# Altium footprint library Airscout_PCB_Lib.PcbLib: 44 footprints (part 2 of 3)
Each footprint in its own frame and in the unit in brackets; x right, y up, seen from the top. Pads: shape width x height; smd on the part's side, far side on the other; paste and mask are expansions set on the pad; w line width, h text height; cw(c..) or ccw(c..) is an arc to the next point about the centre after c.
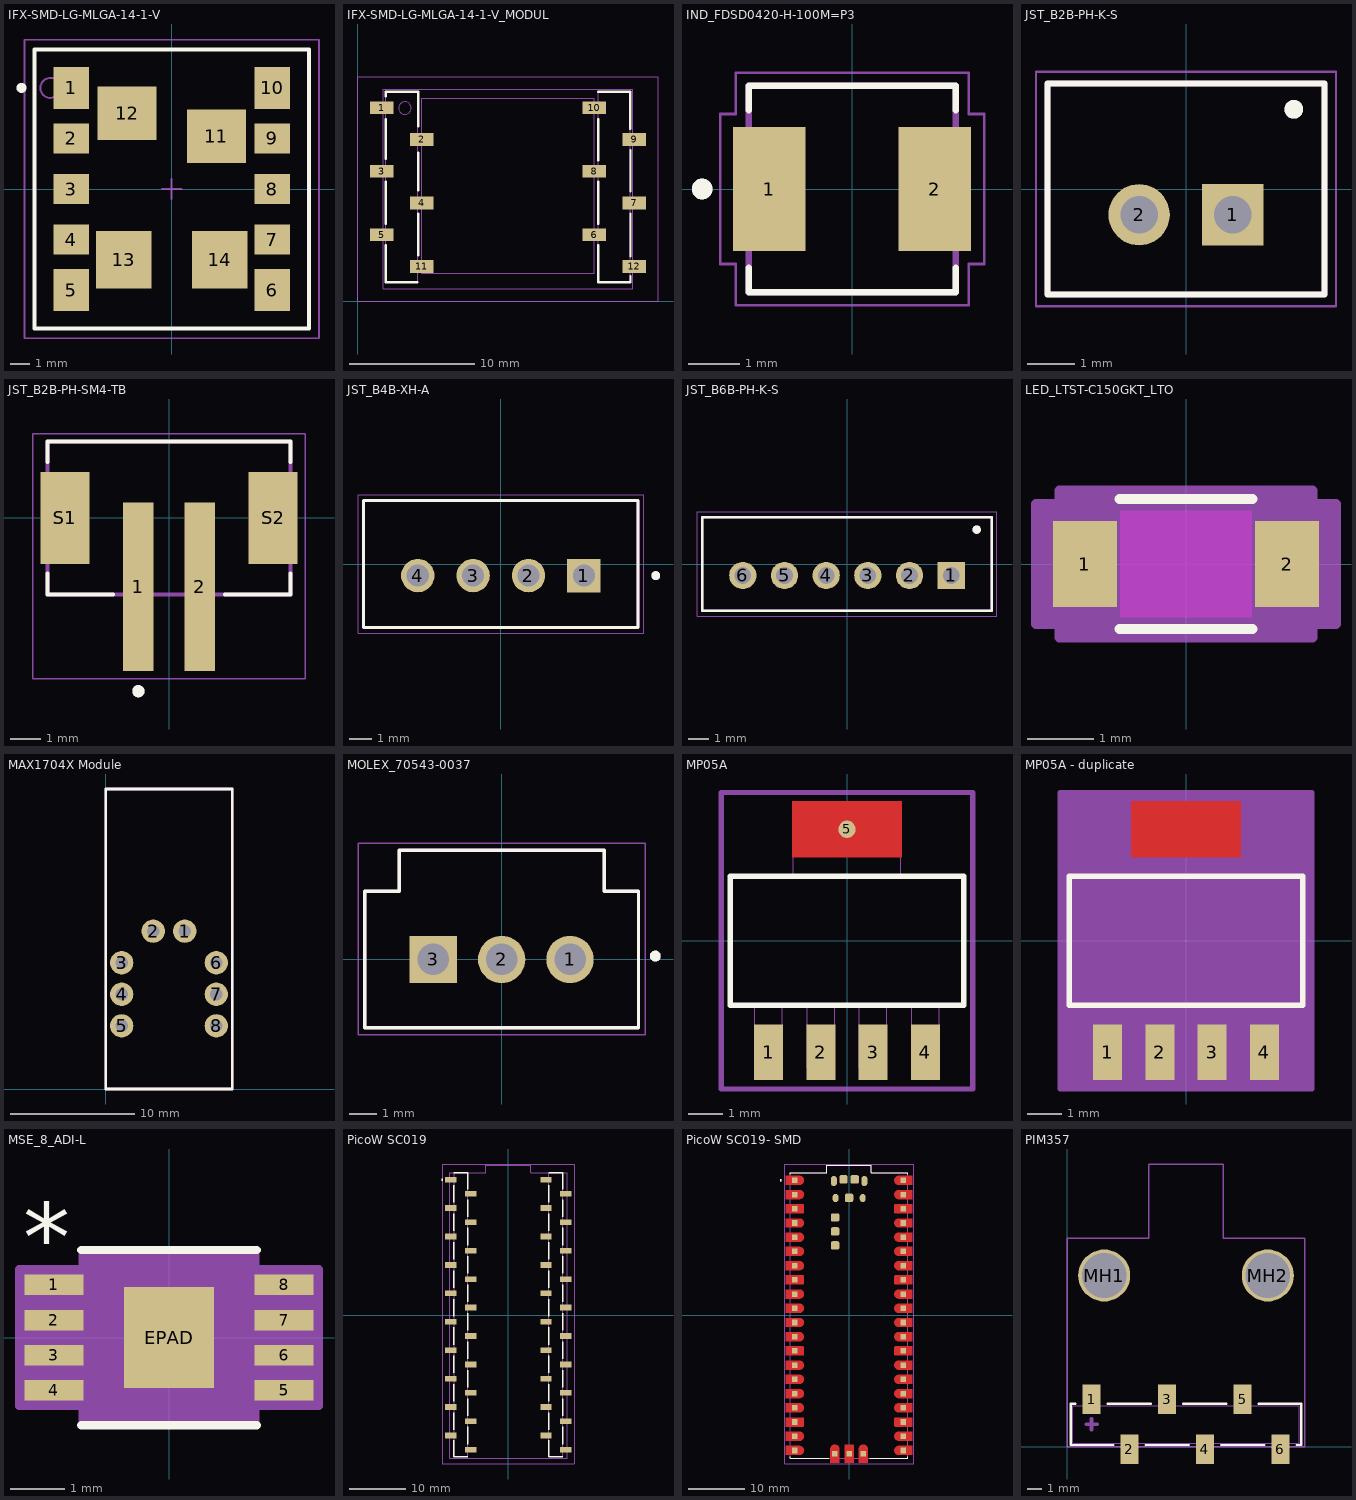
[diagram p1: the footprints below, top view; thin cyan lines are the x and y axes]

## IFX-SMD-LG-MLGA-14-1-V [mm] "Module, 2.54 mm Pitch, 14 Pin, 14.00 mm W X 13.80 mm L X 7.68 mm H Body"
height 7.68
pads (14):
  rect 1.8x2.1 smd paste-0.9 mask+0: 1(-5.05,5.08) 5(-5.05,-5.08) 6(5.05,-5.08) 10(5.05,5.08)
  rect 1.8x1.5 smd paste-0.9 mask+0: 2(-5.05,2.54) 3(-5.05,0) 4(-5.05,-2.54) 7(5.05,-2.54) 8(5.05,0) 9(5.05,2.54)
  rect 2.95x2.7 smd paste-1.475 mask+0: 11(2.245,2.655) 12(-2.245,3.805)
  rect 2.8x2.9 smd paste-1.4 mask+0: 13(-2.415,-3.55) 14(2.415,-3.55)
Top Overlay:
  circle w0.25: c-7.55,5.08 r0.125
  lines w0.2: -6.9,-7 6.9,-7 6.9,7 -6.9,7 -6.9,-7
Top Paste:
  region: -5.7,-4.155 -5.7,-6.005 -4.2,-6.005 -4.2,-4.155
  region: -5.7,-1.89 -5.7,-3.19 -4.2,-3.19 -4.2,-1.89
  region: -5.7,0.65 -5.7,-0.65 -4.2,-0.65 -4.2,0.65
  region: -5.7,3.19 -5.7,1.89 -4.2,1.89 -4.2,3.19
  region: -5.7,6.005 -5.7,4.155 -4.2,4.155 -4.2,6.005
  region: 4.2,6.005 4.2,4.155 5.7,4.155 5.7,6.005
  region: 4.2,3.19 4.2,1.89 5.7,1.89 5.7,3.19
  region: 4.2,0.65 4.2,-0.65 5.7,-0.65 5.7,0.65
  region: 4.2,-1.89 4.2,-3.19 5.7,-3.19 5.7,-1.89
  region: 4.2,-4.155 4.2,-6.005 5.7,-6.005 5.7,-4.155
  region: 2.345,3.855 2.345,2.755 3.555,2.755 3.555,3.855
  region: 2.345,2.555 2.345,1.455 3.555,1.455 3.555,2.555
  region: 0.935,3.855 0.935,2.755 2.145,2.755 2.145,3.855
  region: 0.935,2.555 0.935,1.455 2.145,1.455 2.145,2.555
  region: -2.145,5.005 -2.145,3.905 -0.935,3.905 -0.935,5.005
  region: -2.145,3.705 -2.145,2.605 -0.935,2.605 -0.935,3.705
  region: -3.555,5.005 -3.555,3.905 -2.345,3.905 -2.345,5.005
  region: -3.555,3.705 -3.555,2.605 -2.345,2.605 -2.345,3.705
  region: 2.515,-2.29 2.515,-3.45 3.675,-3.45 3.675,-2.29
  region: 2.515,-3.65 2.515,-4.81 3.675,-4.81 3.675,-3.65
  region: 1.155,-2.29 1.155,-3.45 2.315,-3.45 2.315,-2.29
  region: 1.155,-3.65 1.155,-4.81 2.315,-4.81 2.315,-3.65
  region: -2.315,-2.29 -2.315,-3.45 -1.155,-3.45 -1.155,-2.29
  region: -2.315,-3.65 -2.315,-4.81 -1.155,-4.81 -1.155,-3.65
  region: -3.675,-2.29 -3.675,-3.45 -2.515,-3.45 -2.515,-2.29
  region: -3.675,-3.65 -3.675,-4.81 -2.515,-4.81 -2.515,-3.65
Mechanical 3:
  text ".DESIGNATOR" at -3.643,-0.385 h1.2
Mechanical 13:
  circle w0.1: c-6.1,5.08 r0.5
  lines w0.1: -6.9,-7 -6.9,7 6.9,7 6.9,-7 -6.9,-7
Mechanical 15:
  lines w0.1: -0.5,0 0.5,0 ; 0,-0.5 0,0.5 ; -7.4,-7.5 7.4,-7.5 7.4,7.5 -7.4,7.5 -7.4,-7.5
3D body "LG-MLGA-14-1_Z8B00206105_V09_3D.stp": height 7.68, standoff 0, extent -6.9,-7 6.9,7

## IFX-SMD-LG-MLGA-14-1-V_MODUL [mm] "Module, 2.54 mm Pitch, 14 Pin, 14.00 mm W X 13.80 mm L X 7.68 mm H Body"
height 7.68
pads (12):
  rect 1.905x1.02 smd: 1(1.898,15.5) 2(5.103,12.96) 3(1.898,10.42) 4(5.103,7.88) 5(1.898,5.34) 6(18.897,5.34) 7(22.102,7.88) 8(18.897,10.42) 9(22.102,12.96) 10(18.897,15.5) 11(5.103,2.8) 12(22.102,2.8)
Top Overlay:
  lines w0.2: 2.2,6.2 2.2,9.6 ; 2.2,11.4 2.2,14.6 ; 2.205,4.505 2.205,1.555 4.745,1.555 ; 2.23,16.4 2.23,16.77 4.8,16.77 4.8,14 ; 4.8,3.7 4.8,7 ; 4.8,8.9 4.8,11.9 ; 19.2,6.2 19.2,9.6 ; 19.2,11.3 19.2,14.6 ; 19.23,4.48 19.23,1.53 21.8,1.53 21.8,2 ; 19.23,16.77 21.77,16.77 21.77,13.82 ; 21.8,3.6 21.8,7 ; 21.8,8.8 21.8,12.1
Mechanical 1:
  circle w0.1: c3.75,15.475 r0.5
Mechanical 13:
  lines w0.1: 2,1 2,17 22,17 22,1 2,1 ; 2.23,1.53 2.23,16.75 4.77,16.75 4.77,1.53 2.23,1.53 ; 5.1,2.275 5.1,16.275 18.9,16.275 18.9,2.275 5.1,2.275 ; 19.23,1.53 21.77,1.53 21.77,16.77 19.23,16.77 19.23,1.53
Mechanical 15:
  lines w0.1: 0,0 2,0 24,0 24,18 0,18 0,0 ; 0,0 0,0
3D body "LG-MLGA-14-1_Z8B00206105_V09_3D.stp": height 15.3, standoff 7.62, extent 5.1,2.275 18.9,16.275
3D body "SSM-106-F-SV.stp": height 7.39, standoff -0.1, extent 1.278,1.53 5.85,16.77
3D body "SSM-106-F-SV.stp": height 7.39, standoff -0.1, extent 18.278,1.53 22.85,16.77

## IND_FDSD0420-H-100M=P3 [mm]
pads (2):
  rect 1.4x2.4 smd: 1(-1.6,0) 2(1.6,0)
Top Overlay:
  circle w0.2: c-2.9,0 r0.1
  lines w0.127: -2,-1.52 -2,-2 2,-2 2,-1.52 ; -2,1.52 -2,2 2,2 2,1.52
Mechanical 13:
  circle w0.2: c-2.9,0 r0.1
  lines w0.127: -2,-2 -2,2 2,2 2,-2 -2,-2
Mechanical 15:
  lines w0.05: -2.55,-1.45 -2.25,-1.45 -2.25,-2.25 2.25,-2.25 2.25,-1.45 2.55,-1.45 2.55,1.45 2.25,1.45 2.25,2.25 -2.25,2.25 -2.25,1.45 -2.55,1.45 -2.55,-1.45
3D body "FDSD0420-H-100M=P3.STEP": height 2, standoff 0, extent -2,-2 2,2

## JST_B2B-PH-K-S [mm]
pads (2):
  rect 1.308x1.308 hole 0.8: 1(1,-0.55)
  round 1.308 hole 0.8: 2(-1,-0.55)
Top Overlay:
  circle w0.2: c2.3,1.7 r0.1
  lines w0.127: -2.95,-2.25 2.95,-2.25 2.95,2.25 -2.95,2.25 -2.95,-2.25
Mechanical 13:
  circle w0.2: c2.3,1.7 r0.1
  lines w0.127: -2.95,-2.25 -2.95,2.25 2.95,2.25 2.95,-2.25 -2.95,-2.25
Mechanical 15:
  lines w0.05: -3.2,-2.5 -3.2,2.5 3.2,2.5 3.2,-2.5 -3.2,-2.5
3D body "step_temp.STEP": height 6, standoff -3.4, extent -2.95,-2.25 2.95,2.25

## JST_B2B-PH-SM4-TB [mm]
height 6.6
pads (4):
  rect 1x5.5 smd: 1(-1,-2.25) 2(1,-2.25)
  rect 1.6x3 smd: S1(-3.4,0) S2(3.4,0)
Top Overlay:
  circle w0.2: c-1,-5.66 r0.1
  lines w0.127: -3.975,-1.82 -3.975,-2.5 -1.82,-2.5 ; -3.975,1.82 -3.975,2.5 3.975,2.5 3.975,1.82 ; 1.82,-2.5 3.975,-2.5 3.975,-1.82
Mechanical 13:
  circle w0.2: c-1,-5.66 r0.1
  lines w0.127: -3.975,-2.5 3.975,-2.5 3.975,2.5 -3.975,2.5 -3.975,-2.5
Mechanical 15:
  lines w0.05: -4.45,-5.25 -4.45,2.75 4.45,2.75 4.45,-5.25 -4.45,-5.25
3D body "step_temp.STEP": height 6.75, standoff 0, extent -3.975,-4.5 3.975,2.5

## JST_B4B-XH-A [mm]
height 7
pads (4):
  rect 1.508x1.508 / inner round 1.508 / far side rect 1.508x1.508 hole 1: 1(3.75,-0.525)
  round 1.508 hole 1: 2(1.25,-0.525) 3(-1.25,-0.525) 4(-3.75,-0.525)
Top Overlay:
  circle w0.2: c7,-0.525 r0.1
  lines w0.127: -6.2,-2.875 -6.2,2.875 6.2,2.875 6.2,-2.875 -6.2,-2.875
Mechanical 13:
  circle w0.2: c7,-0.525 r0.1
  lines w0.127: -6.2,-2.875 -6.2,2.875 6.2,2.875 6.2,-2.875 -6.2,-2.875
Mechanical 15:
  lines w0.05: -6.45,-3.125 -6.45,3.125 6.45,3.125 6.45,-3.125 -6.45,-3.125
3D body "step_temp.STEP": height 7, standoff -3.4, extent -6.2,-2.875 6.2,2.875

## JST_B6B-PH-K-S [mm]
pads (6):
  rect 1.308x1.308 hole 0.8: 1(5,-0.55)
  round 1.308 hole 0.8: 2(3,-0.55) 3(1,-0.55) 4(-1,-0.55) 5(-3,-0.55) 6(-5,-0.55)
Top Overlay:
  circle w0.2: c6.223,1.651 r0.1
  lines w0.127: -6.95,-2.25 -6.95,2.25 6.95,2.25 6.95,-2.25 -6.95,-2.25
Mechanical 13:
  circle w0.2: c6.223,1.651 r0.1
  lines w0.127: -6.95,-2.25 6.95,-2.25 6.95,2.25 -6.95,2.25 -6.95,-2.25
Mechanical 15:
  lines w0.05: -7.2,-2.5 7.2,-2.5 7.2,2.5 -7.2,2.5 -7.2,-2.5
3D body "step_temp.STEP": height 6, standoff -3.4, extent -6.95,-2.25 6.95,2.25

## LED_LTST-C150GKT_LTO [mil]
pads (2):
  rect 38x51 smd paste+0 mask+0: 1(-60,0) 2(60,0)
Top Layer keep-out:
  region: -39,-31.5 -39,31.5 39,31.5 39,-31.5
Top Overlay:
  lines w6: -39.38,-38.5 39.38,-38.5 ; -39.38,38.5 39.38,38.5
Keep-Out Layer:
  region: -39,-31.5 -39,31.5 39,31.5 39,-31.5
Mechanical 13:
  lines w1: -65,-33.5 -65,33.5 65,33.5 65,-33.5 -65,-33.5 ; -65,-25.5 -65,25.5 -65,-25.5 ; 65,-25.5 65,25.5 65,-25.5
Mechanical 15:
  region: -75,-35.5 -89,-35.5 -89,35.5 -75,35.5 -75,43.5 75,43.5 75,35.5 89,35.5 89,-35.5 75,-35.5 75,-43.5 -75,-43.5
  lines w6: -89,-35.5 -75,-35.5 -75,-43.5 75,-43.5 75,-35.5 89,-35.5 89,35.5 75,35.5 75,43.5 -75,43.5 -75,35.5 -89,35.5 -89,-35.5
3D body "LED_LTST-C150GKT_LTO.step": height 47.09, standoff 0, extent -65,-33.5 65,33.5

## MAX1704X Module [mil] "Breakout Board"
pads (8):
  round 74 hole 40: 1(250,500) 2(150,500) 3(50,400) 4(50,300) 5(50,200) 6(350,400) 7(350,300) 8(350,200)
Top Overlay:
  lines w8: 0,0 400,0 400,950 0,950 0,0
Mechanical 15:
  lines w8: 0,0 400,0 400,950 0,950 0,0

## MOLEX_70543-0037 [mm]
height 11.81
pads (3):
  round 1.755 hole 1.17: 1(2.54,0) 2(0,0)
  rect 1.755x1.755 hole 1.17: 3(-2.54,0)
Top Overlay:
  circle w0.2: c5.708,0.127 r0.1
  lines w0.127: -5.085,-2.54 -5.085,2.54 -3.81,2.54 -3.81,4.06 3.81,4.06 3.81,2.54 5.085,2.54 5.085,-2.54 -5.085,-2.54
Mechanical 13:
  circle w0.2: c5.708,0.127 r0.1
  lines w0.127: -5.085,-2.54 -5.085,2.54 -3.81,2.54 -3.81,4.06 3.81,4.06 3.81,2.54 5.085,2.54 5.085,-2.54 -5.085,-2.54
Mechanical 15:
  lines w0.05: -5.335,-2.79 5.335,-2.79 5.335,4.31 -5.335,4.31 -5.335,-2.79
3D body "705430037--3DModel-STEP-510211.STEP": height 11.81, standoff -3.3, extent -5.08,-2.54 5.08,4.064

## MP05A [mil]
pads (5):
  rect 33x63 smd paste-31.5 mask-31.5: 1(-88.58,-126) 2(-29.53,-126) 3(29.53,-126) 4(88.58,-126)
  round 19.68 smd mask+4: 5(0,125.98)
Top Layer:
  region: 62,94.5 62,157.5 -62,157.5 -62,94.5
  region: 62,94.5 62,157.5 -62,157.5 -62,94.5
Top Overlay:
  lines w6: -132,-73 132,-73 132,73 -132,73 -132,-73
Top Solder:
  region: 66.93,80.5 66.93,171.5 -66.93,171.5 -66.93,80.5
Mechanical 13:
  lines w1: -132,-73 132,-73 132,73 -132,73 -132,-73 ; -104.08,-143.5 -104.08,-73 -73.08,-73 -73.08,-143.5 -104.08,-143.5 ; -61,73 61,73 61,143.5 -61,143.5 -61,73 ; -45.03,-143.5 -45.03,-73 -14.03,-73 -14.03,-143.5 -45.03,-143.5 ; 14.03,-143.5 14.03,-73 45.03,-73 45.03,-143.5 14.03,-143.5 ; 73.08,-143.5 73.08,-73 104.08,-73 104.08,-143.5 73.08,-143.5
Mechanical 15:
  lines w6: -142,-167.5 -142,167.5 142,167.5 142,-167.5 -142,-167.5
3D body "MP05A.step": height 71.1, standoff 0, extent -132.01,-143.5 132.01,143.5

## MP05A - duplicate [mil]
pads (4):
  rect 33x63 smd paste-31.5 mask-31.5: 1(-88.58,-126) 2(-29.53,-126) 3(29.53,-126) 4(88.58,-126)
Top Layer:
  region: 62,94.5 62,157.5 -62,157.5 -62,94.5
Top Overlay:
  lines w6: -132,-73 -132,73 132,73 132,-73 -132,-73
Top Paste:
  region: 62,94.5 62,157.5 -62,157.5 -62,94.5
Top Solder:
  region: 63,80.5 63,171.5 -63,171.5 -63,80.5
Mechanical 13:
  lines w1: -132,-73 -132,73 132,73 132,-73 -132,-73 ; -104.08,-143.5 -73.08,-143.5 -73.08,-73 -104.08,-73 -104.08,-143.5 ; -61,73 -61,143.5 61,143.5 61,73 -61,73 ; -45.03,-143.5 -14.03,-143.5 -14.03,-73 -45.03,-73 -45.03,-143.5 ; 14.03,-143.5 45.03,-143.5 45.03,-73 14.03,-73 14.03,-143.5 ; 73.08,-143.5 104.08,-143.5 104.08,-73 73.08,-73 73.08,-143.5
Mechanical 15:
  region: 142,-167.5 -142,-167.5 -142,167.5 142,167.5
  lines w6: -142,-167.5 142,-167.5 142,167.5 -142,167.5 -142,-167.5
3D body "MP05A.step": height 71.1, standoff 0, extent -132.01,-143.5 132.01,143.5

## MSE_8_ADI-L [mil]
pads (9):
  rect 43x15 smd paste+0 mask+0: 1(-84,38.39) 2(-84,12.8) 3(-84,-12.8) 4(-84,-38.39) 5(84,-38.39) 6(84,-12.8) 7(84,12.8) 8(84,38.39)
  rect 66x74 smd paste+0 mask+0: EPAD(0,0)
Top Overlay:
  lines w6: -64,-64 64,-64 ; -64,64 64,64
  text "*" at -106.5,48.39 h50
Mechanical 13:
  lines w0: -12,59 ccw(c0,59) 12,59
  lines w1: -99.5,-45.89 -99.5,-30.89 -59,-30.89 -59,-45.89 -99.5,-45.89 ; -99.5,-20.3 -99.5,-5.3 -59,-5.3 -59,-20.3 -99.5,-20.3 ; -99.5,5.3 -99.5,20.3 -59,20.3 -59,5.3 -99.5,5.3 ; -99.5,30.89 -99.5,45.89 -59,45.89 -59,30.89 -99.5,30.89 ; -59,-59 59,-59 59,59 -59,59 -59,-59 ; 59,-45.89 59,-30.89 99.5,-30.89 99.5,-45.89 59,-45.89 ; 59,-20.3 59,-5.3 99.5,-5.3 99.5,-20.3 59,-20.3 ; 59,5.3 59,20.3 99.5,20.3 99.5,5.3 59,5.3 ; 59,30.89 59,45.89 99.5,45.89 99.5,30.89 59,30.89
  text "*" at -106.3,47.24 h50
Mechanical 15:
  region: -63,-49.89 -109.5,-49.89 -109.5,49.89 -63,49.89 -63,63 63,63 63,49.89 109.5,49.89 109.5,-49.89 63,-49.89 63,-63 -63,-63
  lines w6: -109.5,-49.89 -109.5,49.89 -63,49.89 -63,63 63,63 63,49.89 109.5,49.89 109.5,-49.89 63,-49.89 63,-63 -63,-63 -63,-49.89 -109.5,-49.89
3D body "MSE_8_ADI.step": height 43.11, standoff -2.01, extent -99.49,-59.02 99.49,59.02

## PicoW SC019 [mm] "For Description look into Schematics"
pads (40):
  rect 2x1.02 smd: 1(-10.278,24.26) 2(-6.722,21.72) 3(-10.278,19.18) 4(-6.722,16.64) 5(-10.278,14.1) 6(-6.722,11.56) 7(-10.278,9.02) 8(-6.722,6.48) 9(-10.278,3.94) 10(-6.722,1.4) 11(-10.278,-1.14) 12(-6.722,-3.68) 13(-10.278,-6.22) 14(-6.722,-8.76) 15(-10.278,-11.3) 16(-6.722,-13.84) 17(-10.278,-16.38) 18(-6.722,-18.92) 19(-10.278,-21.46) 20(-6.722,-24) 21(10.278,-24) 22(6.722,-21.46) 23(10.278,-18.92) 24(6.722,-16.38) 25(10.278,-13.84) 26(6.722,-11.3) 27(10.278,-8.76) 28(6.722,-6.22) 29(10.278,-3.68) 30(6.722,-1.14) 31(10.278,1.4) 32(6.722,3.94) 33(10.278,6.48) 34(6.722,9.02) 35(10.278,11.56) 36(6.722,14.1) 37(10.278,16.64) 38(6.722,19.18) 39(10.278,21.72) 40(6.722,24.26)
Top Overlay:
  circle w0.2: c-11.8,24.26 r0.1
  lines w0.254: -9.77,-22.32 -9.77,-25.27 -7.23,-25.27 ; -9.77,-20.444 -9.77,-17.396 ; -9.77,-15.364 -9.77,-12.316 ; -9.77,-10.284 -9.77,-7.236 ; -9.77,-5.204 -9.77,-2.156 ; -9.77,-0.124 -9.77,2.924 ; -9.77,4.956 -9.77,8.004 ; -9.77,10.036 -9.77,13.084 ; -9.77,15.116 -9.77,18.164 ; -9.77,20.196 -9.77,23.244 ; -9.77,25.53 -7.23,25.53 -7.23,22.58 ; -7.23,-22.984 -7.23,-19.936 ; -7.23,-17.904 -7.23,-14.856 ; -7.23,-12.824 -7.23,-9.776 ; -7.23,-7.744 -7.23,-4.696 ; -7.23,-2.664 -7.23,0.384 ; -7.23,2.416 -7.23,5.464 ; -7.23,7.496 -7.23,10.544 ; -7.23,12.576 -7.23,15.624 ; -7.23,17.656 -7.23,20.704 ; 7.23,-22.32 7.23,-25.27 9.77,-25.27 ; 7.23,-20.444 7.23,-17.396 ; 7.23,-15.364 7.23,-12.316 ; 7.23,-10.284 7.23,-7.236 ; 7.23,-5.204 7.23,-2.156 ; 7.23,-0.124 7.23,2.924 ; 7.23,4.956 7.23,8.004 ; 7.23,10.036 7.23,13.084 ; 7.23,15.116 7.23,18.164 ; 7.23,20.196 7.23,23.244 ; 7.23,25.53 9.77,25.53 9.77,22.58 ; 9.77,-22.984 9.77,-19.936 ; 9.77,-17.904 9.77,-14.856 ; 9.77,-12.824 9.77,-9.776 ; 9.77,-7.744 9.77,-4.696 ; 9.77,-2.664 9.77,0.384 ; 9.77,2.416 9.77,5.464 ; 9.77,7.496 9.77,10.544 ; 9.77,12.576 9.77,15.624 ; 9.77,17.656 9.77,20.704
Mechanical 13:
  circle w0.2: c-11.8,24.26 r0.1
  lines w0.1: -9.77,-25.27 -9.77,25.53 ; -7.23,-25.27 -7.23,25.53 ; 7.23,-25.27 7.23,25.53 ; 9.77,-25.27 9.77,25.53
  lines w0.127: -10.5,-25.5 -10.5,25.5 -4,25.5 -4,26.8 4,26.8 4,25.5 10.5,25.5 10.5,-25.5 -10.5,-25.5
Mechanical 15:
  lines w0.05: -11.8,-26.55 -11.8,27.05 11.8,27.05 11.8,-26.55 -11.8,-26.55
3D body "SSM-120-L-SV-BE-K-TR.stp": height 7.52, standoff -0.1, extent 6.087,-25.27 10.659,25.53
3D body "SSM-120-L-SV-BE-K-TR.stp": height 7.52, standoff -0.1, extent -10.913,-25.27 -6.341,25.53
3D body "step_temp.STEP": height 11.23, standoff 7.5, extent -10.5,-25.5 10.5,26.8

## PicoW SC019- SMD [mm] "For Description look into Schematics"
pads (53):
  rect 1x1 smd paste-1 mask+0: 1(-9.69,24.13) 2(-9.69,21.59) 3(-9.69,19.05) 4(-9.69,16.51) 5(-9.69,13.97) 6(-9.69,11.43) 7(-9.69,8.89) 8(-9.69,6.35) 9(-9.69,3.81) 10(-9.69,1.27) 11(-9.69,-1.27) 12(-9.69,-3.81) 13(-9.69,-6.35) 14(-9.69,-8.89) 15(-9.69,-11.43) 16(-9.69,-13.97) 17(-9.69,-16.51) 18(-9.69,-19.05) 19(-9.69,-21.59) 20(-9.69,-24.13) 21(9.69,-24.13) 22(9.69,-21.59) 23(9.69,-19.05) 24(9.69,-16.51) 25(9.69,-13.97) 26(9.69,-11.43) 27(9.69,-8.89) 28(9.69,-6.35) 29(9.69,-3.81) 30(9.69,-1.27) 31(9.69,1.27) 32(9.69,3.81) 33(9.69,6.35) 34(9.69,8.89) 35(9.69,11.43) 36(9.69,13.97) 37(9.69,16.51) 38(9.69,19.05) 39(9.69,21.59) 40(9.69,24.13) D1(-2.54,-24.7) D2(0,-24.7) D3(2.54,-24.7)
  oval 1.1x1.8 smd: A(-2.725,24) B(2.725,24)
  oval 1.05x1.45 smd: C(-2.425,20.97) D(2.425,20.97)
  rrect40% 1.5x1.5 smd: TP1(0,21) TP2(1,24.3) TP3(-1,24.3) TP4(-2.5,17.5) TP5(-2.5,15) TP6(-2.5,12.5)
Top Layer:
  drawing of 43 lines, arcs and shapes, not listed
Top Overlay:
  circle w0.2: c-12.19,24.13 r0.1
  lines w0.127: -10.5,-25.25 -10.5,-25.5 -3.66,-25.5 ; -10.5,25.25 -10.5,25.5 -4,25.5 -4,26.8 4,26.8 4,25.5 10.5,25.5 10.5,25.25 ; 3.66,-25.5 10.5,-25.5 10.5,-25.25
Top Paste:
  drawing of 43 lines, arcs and shapes, not listed
Top Solder:
  drawing of 43 lines, arcs and shapes, not listed
Mechanical 13:
  circle w0.2: c-12.19,24.13 r0.1
  lines w0.127: -10.5,-25.5 10.5,-25.5 10.5,25.5 4,25.5 4,26.8 -4,26.8 -4,25.5 -10.5,25.5 -10.5,-25.5
Mechanical 15:
  lines w0.05: -11.54,-26.55 11.54,-26.55 11.54,27.05 -11.54,27.05 -11.54,-26.55
3D body "step_temp.STEP": height 6.27, standoff 2.54, extent -10.5,-25.5 10.5,26.8

## PIM357 [mm] "With BME680 Sensor"
pads (8):
  rect 1.2x2 smd paste+0 mask+0.025: 1(1.65,3.176) 2(4.19,-0.176) 3(6.73,3.176) 4(9.27,-0.176) 5(11.81,3.176) 6(14.35,-0.176)
  round 3.5 hole 3 unplated: MH1(2.5,11.5) MH2(13.5,11.5)
Top Overlay:
  lines w0.152: 0.568,2.872 0.253,2.872 0.253,0.103 3.108,0.103 ; 2.732,2.872 5.648,2.872 ; 5.272,0.103 8.188,0.103 ; 7.812,2.872 10.728,2.872 ; 10.352,0.103 13.268,0.103 ; 12.892,2.872 15.747,2.872 15.747,0.103 15.432,0.103
Mechanical 7:
  lines w0.254: 1.285,1.5 2.015,1.5 ; 1.65,1.135 1.65,1.865
Mechanical 13:
  lines w0.025: 0.38,0.23 0.38,2.745 15.62,2.745 15.62,0.23 0.38,0.23
  lines w0.1: 0,1.5 0,0 ; 2.25,11.5 2.75,11.5 ; 2.5,11.25 2.5,11.75 ; 16,11.5 16,14 ; 0,0 0,14 5.5,14 5.5,19 10.5,19 10.5,14 16,14 ; 0,0 16,0 16,14
3D body "NPTC061KFXC-RC.STEP": height 7.49, standoff 0, extent 0.38,-0.786 15.62,3.507